# Altium footprint library clock.PcbLib: 34 footprints (part 1 of 3)
Each footprint in its own frame and in the unit in brackets; x right, y up, seen from the top. Pads: shape width x height; smd on the part's side, far side on the other; paste and mask are expansions set on the pad; w line width, h text height; cw(c..) or ccw(c..) is an arc to the next point about the centre after c.
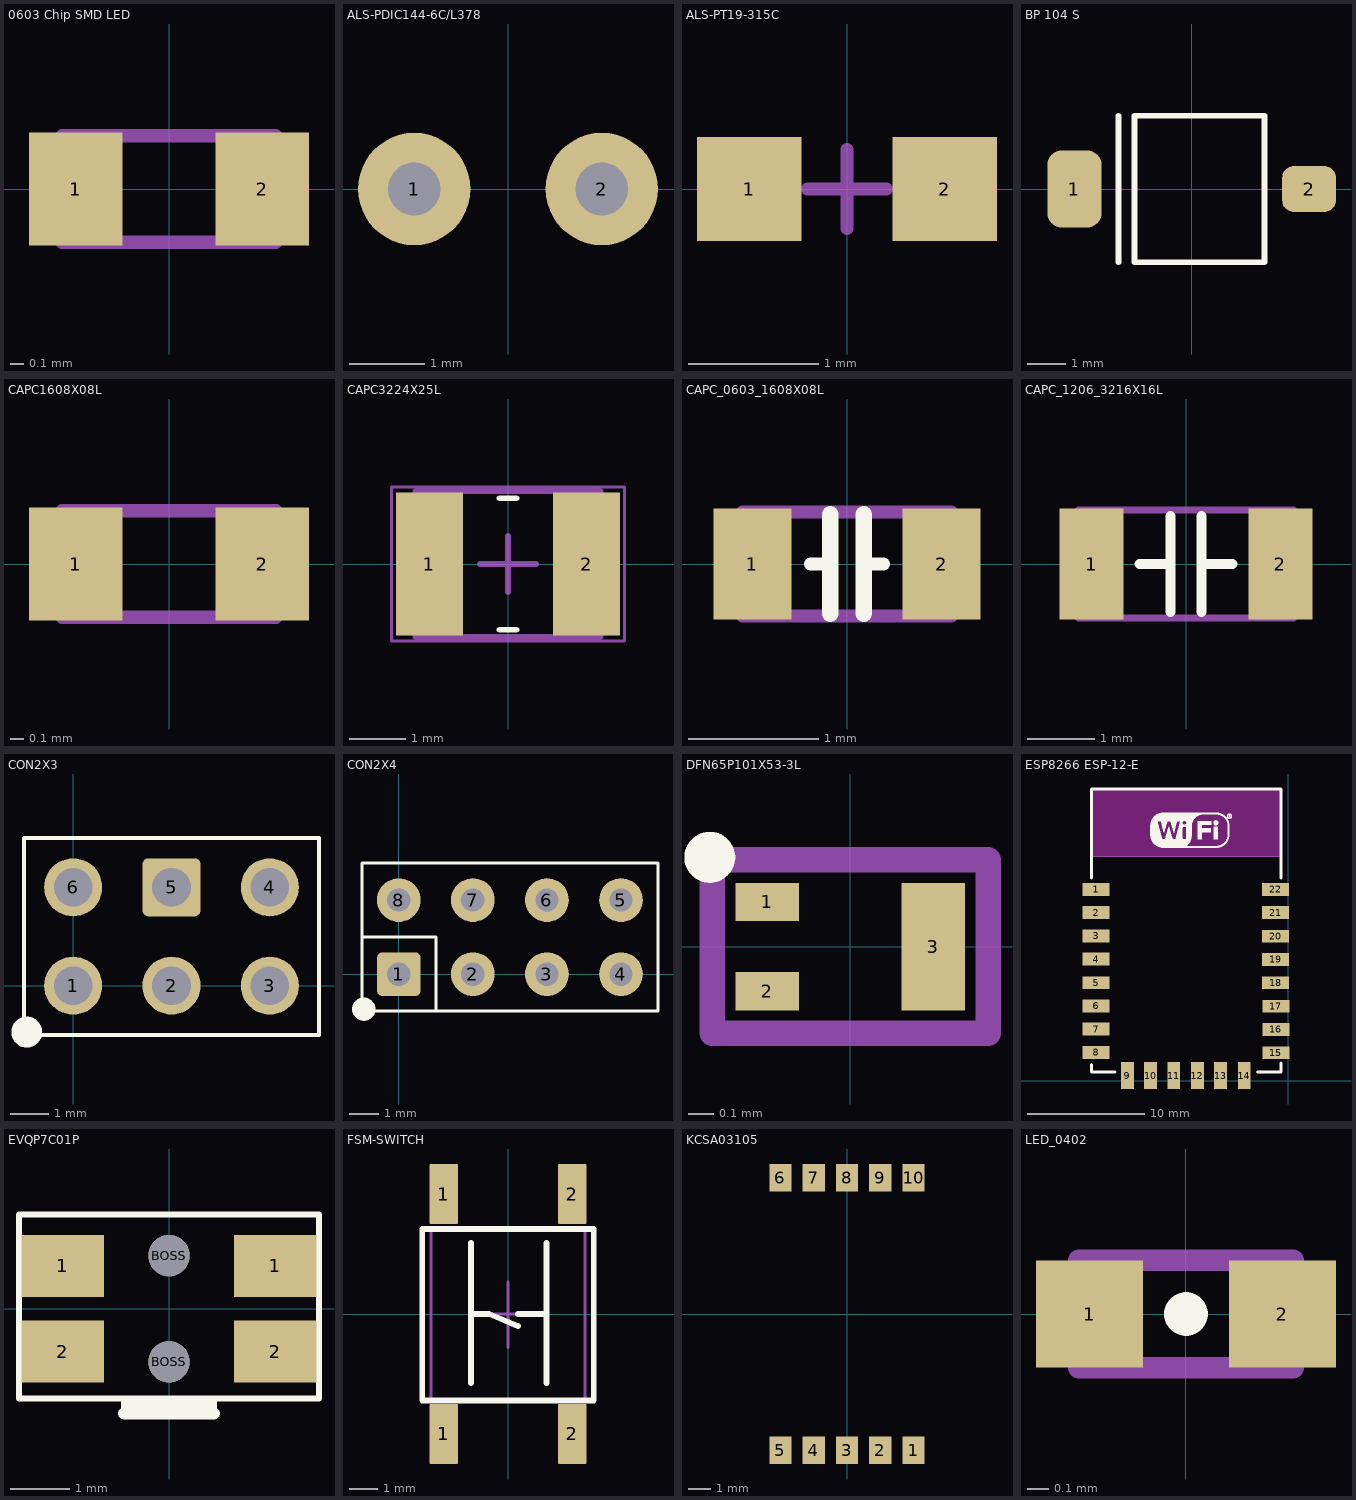
[diagram p0: the footprints below, top view; thin cyan lines are the x and y axes]

## 0603 Chip SMD LED [mm] "LED 0603"
height 0.8
pads (2):
  rrect1% 0.7x0.85 smd mask+0.05: 1(-0.7,0) 2(0.7,0)
Top Assembly:
  lines w0.1: -0.8,-0.4 -0.8,0.4 0.8,0.4 0.8,-0.4 -0.8,-0.4
3D body "LED_0603_KT-0603R.step": height 0.6, standoff 0, extent -0.8,-0.4 0.8,0.4

## ALS-PDIC144-6C/L378 [mm] "Through hole phototransistor 3mm hat"
pads (2):
  round 1.5 hole 0.7: 1(-1.25,0) 2(1.25,0)
3D body "ALS-PDIC144-6C_BENT_LEGS4.step": height 2.5, standoff -1.7, extent -1.6,-0.2 1.9,18

## ALS-PT19-315C [mm] "Phototransistor 3216"
pads (2):
  rrect1% 0.8x0.8 smd: 1(-0.75,0) 2(0.75,0)
Top Assembly:
  lines w0.102: -0.3,0 0.3,0 ; 0,-0.3 0,0.3
3D body "ALS_2012_0805_R5.step": height 0.55, standoff 0, extent -0.85,-0.403 0.85,0.404

## BP 104 S [mm]
pads (2):
  rrect50% 1.4x2 smd paste+0 mask+0: 1(-3.05,0)
  rrect50% 1.4x1.2 smd paste+0 mask+0: 2(3.05,0)
Top Overlay:
  lines w0.152: -1.905,-1.905 -1.905,1.905 ; -1.491,-1.905 1.887,-1.905 1.887,1.905 -1.491,1.905 -1.491,-1.905
3D body "BP_104_S_100414_geometry.STEP": height 1.2, standoff 0, extent -3.25,-1.951 3.25,1.948

## CAPC1608X08L [mm] "Chip Capacitor, 2-Leads, Body 1.60x0.80mm, IPC High Density"
height 0.8
pads (2):
  rrect1% 0.7x0.85 smd mask+0.05: 1(-0.7,0) 2(0.7,0)
Top Assembly:
  lines w0.1: -0.8,-0.4 -0.8,0.4 0.8,0.4 0.8,-0.4 -0.8,-0.4
3D body "CAPC1608X08L.step": height 0.8, standoff 0, extent -0.8,-0.4 0.8,0.4

## CAPC3224X25L [mm] "Chip Capacitor, 2-Leads, Body 3.20x2.45mm, IPC High Density"
height 2.5
pads (2):
  rrect1% 1.2x2.55 smd: 1(-1.4,0) 2(1.4,0)
Top Overlay:
  lines w0.102: -0.15,-1.175 0.15,-1.175 ; -0.15,1.175 0.15,1.175
Top Assembly:
  lines w0.1: -1.65,-1.3 1.65,-1.3 1.65,1.3 -1.65,1.3 -1.65,-1.3
Mechanical 15:
  lines w0.05: -2.075,-1.375 -2.075,1.375 2.075,1.375 2.075,-1.375 -2.075,-1.375
  lines w0.1: -0.5,0 0.5,0 ; 0,-0.5 0,0.5
3D body "CAPC3224X25L.step": height 2.5, standoff 0, extent -1.65,-1.3 1.65,1.3

## CAPC_0603_1608X08L [mm] "Chip Capacitor 0603"
height 0.8
pads (2):
  rrect1% 0.6x0.85 smd: 1(-0.725,0) 2(0.725,0)
Top Overlay:
  lines w0.102: -0.279,0 -0.127,0 ; 0.127,0 0.279,0
  lines w0.127: -0.127,-0.381 -0.127,0.381 ; 0.127,-0.381 0.127,0.381
Top Assembly:
  lines w0.1: -0.8,-0.4 0.8,-0.4 0.8,0.4 -0.8,0.4 -0.8,-0.4
3D body "CAPC_0603_1608X08L.step": height 0.8, standoff 0, extent -0.8,-0.4 0.8,0.4

## CAPC_1206_3216X16L [mm] "Chip Capacitor 1206"
height 1.6
pads (2):
  rrect1% 0.95x1.65 smd: 1(-1.4,0) 2(1.4,0)
Top Overlay:
  lines w0.152: -0.686,0 -0.229,0 ; -0.229,-0.711 -0.229,0.711 ; 0.229,-0.711 0.229,0.711 ; 0.229,0 0.686,0
Top Assembly:
  lines w0.1: -1.6,-0.8 1.6,-0.8 1.6,0.8 -1.6,0.8 -1.6,-0.8
3D body "CAPC_1206_3216X16L.step": height 1.6, standoff 0, extent -1.6,-0.8 1.6,0.8

## CON2X3 [mm] "2x3 2.54mm"
pads (6):
  round 1.5 hole 1 paste+0 mask+0: 1(0,0) 2(2.54,0) 3(5.08,0) 4(5.08,2.54) 6(0,2.54)
  rrect20% 1.5x1.5 hole 1 paste+0 mask+0: 5(2.54,2.54)
Top Overlay:
  circle w0.4: c-1.2,-1.2 r0.2
  lines w0.102: -1.27,-1.27 -1.27,3.81 6.35,3.81 6.35,-1.27 -1.27,-1.27
3D body "2x3 TH Vert 100mil.step": height 8.38, standoff -3.3, extent -1.27,-1.27 6.35,3.81

## CON2X4 [mm] "1.27 4 x 2"
pads (8):
  rrect25% 1.5x1.5 hole 0.8: 1(0,0)
  round 1.5 hole 0.8: 2(2.54,0) 3(5.08,0) 4(7.62,0) 5(7.62,2.54) 6(5.08,2.54) 7(2.54,2.54) 8(0,2.54)
Top Overlay:
  circle w0.4: c-1.2,-1.2 r0.2
  lines w0.102: -1.27,1.27 1.27,1.27 1.27,-1.27 ; -1.27,-1.27 8.89,-1.27 8.89,3.81 -1.27,3.81 -1.27,-1.27
3D body "2x4 TH Vert 100mil.step": height 8.38, standoff -3.3, extent -1.27,-1.27 8.89,3.81

## DFN65P101X53-3L [mm] "DFN, 3-Leads, Body 0.61x1.01mm, Pitch 0.65mm, IPC High Density"
height 0.53
pads (3):
  rect 0.25x0.15 smd: 1(-0.325,0.175) 2(-0.325,-0.175)
  rect 0.25x0.5 smd: 3(0.325,0)
Top Overlay:
  circle w0.1: c-0.55,0.35 r0.05
Top Assembly:
  lines w0.1: -0.54,-0.34 0.54,-0.34 0.54,0.34 -0.54,0.34 -0.54,-0.34
3D body "DFN65P101X53-3L.step": height 0.53, standoff 0, extent -0.537,-0.337 0.537,0.337

## ESP8266 ESP-12-E [mm] "ESP8266 ESP-12-E"
pads (22):
  rrect1% 2.3x1.1 smd: 1(-16.486,16.408) 2(-16.486,14.427) 3(-16.486,12.421) 4(-16.486,10.439) 5(-16.486,8.407) 6(-16.486,6.426) 7(-16.486,4.445) 8(-16.486,2.438) 15(-1.065,2.413) 16(-1.065,4.42) 17(-1.065,6.401) 18(-1.091,8.407) 19(-1.091,10.414) 20(-1.091,12.395) 21(-1.091,14.427) 22(-1.091,16.408)
  rrect1% 1.1x2.3 smd: 9(-13.792,0.456) 10(-11.811,0.456) 11(-9.83,0.456) 12(-7.798,0.456) 13(-5.817,0.456) 14(-3.785,0.456)
Top Overlay:
  drawing of 1267 lines, arcs and shapes, not listed
Keep-Out Layer:
  rectangle: -16.891,19.252 -0.583,25.019
Top Assembly:
  lines w0.051: -16.839,19.252 -0.583,19.252
3D body "ESP-12F.STEP": height 3.17, standoff 0, extent -16.763,0.827 -0.763,24.827

## EVQP7C01P [mm] "Side actuated tactile switch"
height 1.35
pads (6):
  rrect1% 1.4x1.05 smd mask+0.05: 1(-1.8,0.725) 1(1.8,0.725) 2(-1.8,-0.725) 2(1.8,-0.725)
  round 0.7 hole 0.7 unplated: BOSS(0,-0.9) BOSS(0,0.9)
Top Overlay:
  rectangle: -0.762,-1.778 0.762,-1.524
  lines w0.102: -0.762,-1.778 -0.762,-1.524 ; 0.762,-1.778 0.762,-1.524 ; -2.54,-1.524 2.54,-1.524 2.54,1.6 -2.54,1.6 -2.54,-1.524
  lines w0.203: -0.762,-1.778 0.762,-1.778
3D body "EVQP7-LC-01P_FIXED.step": height 1.5, standoff -0.35, extent -2.35,-2.1 2.35,1.594

## FSM-SWITCH [mm]
pads (4):
  rrect10% 1x2.1 smd: 1(-2.25,-4.2) 1(-2.25,4.2) 2(2.25,-4.2) 2(2.25,4.2)
Top Overlay:
  lines w0.2: 3,-3.028 -3,-3.028 -3,2.972 3,2.972
  lines w0.203: -1.3,-2.416 -1.3,2.487 ; -1.3,0 -0.66,0 0.353,-0.425 ; 0.353,0 1.35,0 ; 1.35,-2.416 1.35,2.487 ; 3,-3.028 3,2.972
Mechanical 15:
  lines w0.1: -2.7,-3.028 2.7,-3.028 2.7,2.972 -2.7,2.972 -2.7,-3.028
  lines w0.102: -1.115,0 0,0 ; 0,-1.171 0,0 ; 0,-0.028 0,1.115 ; 1.013,0 0,0
3D body "switch.stp.step": height 5.07, standoff -0.01, extent -3,-5 3,5

## KCSA03105 [mm]
pads (10):
  rrect1% 1x1.25 smd: 1(3,-6.132) 2(1.5,-6.132) 3(0,-6.132) 4(-1.5,-6.132) 5(-3,-6.132) 6(-3,6.132) 7(-1.5,6.132) 8(0,6.132) 9(1.5,6.132) 10(3,6.132)
3D body "DSM7UA30101_rev02.step": height 1.6, standoff -1.5, extent -3.8,-6.502 3.8,6.498

## LED_0402 [mm] "LED_0402"
height 0.5
pads (2):
  rrect1% 0.5x0.5 smd: 1(-0.45,0) 2(0.45,0)
Top Overlay:
  circle w0.152: c0,0 r0.025
Top Assembly:
  lines w0.1: -0.5,-0.25 0.5,-0.25 0.5,0.25 -0.5,0.25 -0.5,-0.25
3D body "LED_0402.step": height 0.2, standoff 0, extent -0.5,-0.3 0.5,0.3